# Altium integrated library ADC.IntLib: 8 symbols
Pins are listed as number, name and electrical type; pins without a type are passive.

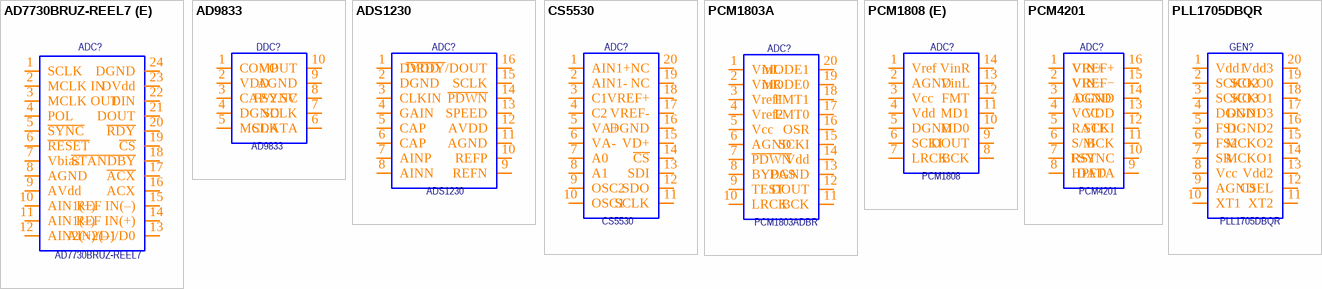
[diagram p0: symbols AD7730BRUZ-REEL7 (E) to PLL1705DBQR]

## AD7730BRUZ-REEL7 (E)
designator ADC?, comment AD7730BRUZ-REEL7
ANALOG TO DIGITAL CONVERTERS (ADCS) TSSOP-24 ROHS; Manufacturer PartNumber: AD7730; Publisher: Catcatcat Electronics; Operating Temperature: -40C to +85C; website developer: http://catcatcat.d-lan.dp.ua/; Pricing LCSC: 8.8841; HelpURL: https://datasheet.lcsc.com/szlcsc/1907181731_Analog-Devices-ADI-AD7730BRUZ-REEL7_C403860.pdf; Package / Case: TSSOP-24_4.4x7.8x0.65P; PartNumber LCSC: C403860; Assembly type: Extended Part; Value: AD7730BRUZ-REEL7
footprint TSSOP-24
pins: 1 SCLK, 2 MCLK IN, 3 MCLK OUT, 4 POL, 5 ~{SYNC}, 6 ~{RESET}, 7 Vbias, 8 AGND, 9 AVdd, 10 AIN1(+), 11 AIN1(–), 12 AIN2(+)/D1, 13 AIN2(–)/D0, 14 REF IN(+), 15 REF IN(–), 16 ACX, 17 ~{ACX}, 18 ~{STANDBY}, 19 ~{CS}, 20 ~{RDY}, 21 DOUT, 22 DIN, 23 DVdd, 24 DGND

## AD9833
designator DDC?
IC WAVEFORM GEN PROG 10MSOP; Manufacturer: Analog Devices Inc.; Manufacturer PartNumber: AD9833BRMZ-REEL; Note: Interface - Direct Digital Synthesis (DDS); Voltage: 2.3V ~ 5.5V; Detailed Description: Direct Digital Synthesis IC 10 b 25MHz 28 b Tuning 10-MSOP; Publisher: Catcatcat Electronics; Operating Temperature: -40°C ~ 105°C; website developer: http://catcatcat.d-lan.dp.ua/; PartNumber Digi-Key: AD9833BRMZ-REEL; Pricing Digi-Key: 5.48600; HelpURL: https://www.analog.com/media/en/technical-documentation/data-sheets/AD9833.pdf; Dealer Digi-Key: https://www.digikey.com/product-detail/en/analog-devices-inc/AD9833BRMZ-REEL/AD9833BRMZ-REELTR-ND/993964; Package / Case: 10-TFSOP, 10-MSOP (0.118", 3.00mm Width); Assembly type: Basic Extended Part; Value: AD9833
footprint MSOP-10
pins: 1 COMP, 2 VDD, 3 CAP/2.5V, 4 DGND, 5 MCLK, 6 SDATA, 7 SCLK, 8 FSYNC, 9 AGND, 10 VOUT

## ADS1230
designator ADC?
ADC; Publisher: Catcatcat Electronics; Operating Temperature: -40C to +85C; website developer: http://catcatcat.d-lan.dp.ua/; Assembly type: Basic Extended Part
footprint 16TSSOP_R
footprint 16TSSOP
footprint 16TSSOP_M
pins: 1 DVDD, 2 DGND, 3 CLKIN, 4 GAIN, 5 CAP, 6 CAP, 7 AINP, 8 AINN, 9 REFN, 10 REFP, 11 AGND, 12 AVDD, 13 SPEED, 14 ~{PDWN}, 15 SCLK, 16 ~{DRDY}/DOUT

## CS5530
designator ADC?
ADC; Publisher: Catcatcat Electronics; Operating Temperature: -40C to +85C; website developer: http://catcatcat.d-lan.dp.ua/; Assembly type: Basic Extended Part
footprint SSOP-20
pins: 1 AIN1+, 2 AIN1-, 3 C1, 4 C2, 5 VA+, 6 VA-, 7 A0, 8 A1, 9 OSC2, 10 OSC1, 11 SCLK, 12 SDO, 13 SDI, 14 ~{CS}, 15 VD+, 16 DGND, 17 VREF-, 18 VREF+, 19 NC, 20 NC

## PCM1803A
designator ADC?  value PCM1803ADBR
IC ADC 24BIT STER 96KHZ 20-SSOP; Manufacturer: Texas Instruments; Note: 96k; Voltage: 2.7V ~ 3.6V, 4.5V ~ 5.5V; Detailed Description: ADC, Audio 24 bit 96k Serial 20-SSOP; Publisher: Catcatcat Electronics; Operating Temperature: -40C to +85C; website developer: http://catcatcat.d-lan.dp.ua/; PartNumber Digi-Key: PCM1803ADBR; Pricing Digi-Key: 1.88727; HelpURL: http://www.ti.com/lit/ds/symlink/pcm1803a.pdf; Manufacturer PartNumber: PCM1803ADBR; Dealer Digi-Key: https://www.digikey.com/product-detail/en/texas-instruments/PCM1803ADBR/296-26305-2-ND/1573343; Package / Case: 20-SSOP (0.209", 5.30mm Width); Assembly type: Basic Extended Part
footprint SSOP-20
pins: 1 VinL, 2 VinR, 3 Vref1, 4 Vref2, 5 Vcc, 6 AGND, 7 ~{PDWN}, 8 BYPAS, 9 TEST, 10 LRCK, 11 BCK, 12 DOUT, 13 DGND, 14 Vdd, 15 SCKI, 16 OSR, 17 FMT0, 18 FMT1, 19 MODE0, 20 MODE1

## PCM1808 (E)
designator ADC?  value PCM1808
IC ADC 24BIT STER 96KHZ 14-TSSOP; Manufacturer: Texas Instruments; Manufacturer PartNumber: PCM1808PWR; Voltage: 2.7V ~ 3.6V, 4.5V ~ 5.5V; Detailed Description: ADC, Audio 24 bit 96k Serial 14-TSSOP; Publisher: Catcatcat Electronics; Operating Temperature: -10°C ~ 70°C; website developer: http://catcatcat.d-lan.dp.ua/; Dealer LCSC: https://ru.aliexpress.com/item/5-PCM1808-PCM1808PWR-TSSOP14/32937073372.html?spm=a2g0v.search0604.3.1.11d22ddesxi7Oo&transAbTest=ae803_3&ws_ab_test=searchweb0_0%2Csearchweb201602_3_10065_10068_319_10059_10884_317_10887_10696_321_322_10084_453_10083_454_10103_10618_10307_537_536_10902%2Csearchweb201603_59%2CppcSwitch_0&algo_pvid=3a2f66d0-29a9-43b9-b55f-f981b50db618&algo_expid=3a2f66d0-29a9-43b9-b55f-f981b50db618-0; PartNumber Digi-Key: PCM1808PWR; Pricing Digi-Key: 0.95040; Pricing LCSC: 0.5044; HelpURL: http://www.ti.com/lit/ds/symlink/pcm1808.pdf; Dealer Digi-Key: https://www.digikey.com/product-detail/en/texas-instruments/PCM1808PWR/296-26307-2-ND/1573355; Package / Case: 14-TSSOP (0.173", 4.40mm Width)  Width); PartNumber LCSC: C55513; Assembly type: Extended Part
footprint TSSOP-14 (PW)
pins: 1 Vref, 2 AGND, 3 Vcc, 4 Vdd, 5 DGND, 6 SCKI, 7 LRCK, 8 BCK, 9 DOUT, 10 MD0, 11 MD1, 12 FMT, 13 VinL, 14 VinR

## PCM4201
designator ADC?
IC ADC 24BIT 1CH AUDIO 16-TSSOP; Manufacturer: Texas Instruments; Manufacturer PartNumber: PCM4201PWR; Voltage: 1.65V ~ 3.6V, 5V; Publisher: Catcatcat Electronics; Operating Temperature: -10°C ~ 70°C; website developer: http://catcatcat.d-lan.dp.ua/; PartNumber Digi-Key: PCM4201PWR; Pricing Digi-Key: 2.32750; HelpURL: http://www.ti.com/lit/ds/symlink/pcm4201.pdf; Dealer Digi-Key: https://www.digikey.com/product-detail/en/texas-instruments/PCM4201PWR/296-43652-2-ND/1573432; Package / Case: 16-TSSOP (0.173", 4.40mm Width); Assembly type: Basic Extended Part; Value: PCM4201
footprint 16TSSOP_R
footprint 16TSSOP
footprint 16TSSOP_M
pins: 1 VIN+, 2 VIN−, 3 AGND, 4 VCC, 5 RATE, 6 S/M, 7 RST, 8 HPFD, 9 DATA, 10 FSYNC, 11 BCK, 12 SCKI, 13 VDD, 14 DGND, 15 VREF−, 16 VREF+

## PLL1705DBQR
designator GEN?  value PLL1705DBQR
IC PLL MULTI-CLK GEN DUAL 20QSOP; Manufacturer: Texas Instruments; Publisher: Catcatcat Electronics; Operating Temperature: -40C to +85C; website developer: http://catcatcat.d-lan.dp.ua/; PartNumber Digi-Key: PLL1705DBQR; Pricing Digi-Key: 2.42060; HelpURL: http://www.ti.com/lit/ds/symlink/pll1705.pdf; Manufacturer PartNumber: PLL1705DBQR; Dealer Digi-Key: https://www.digikey.com/product-detail/en/texas-instruments/PLL1705DBQR/PLL1705DBQR-ND/1573483; Package / Case: 20-SSOP (0.154", 3.90mm Width); Assembly type: Basic Extended Part
footprint SSOP-20
pins: 1 Vdd1, 2 SCKO2, 3 SCKO3, 4 DGND1, 5 FS1, 6 FS2, 7 SR, 8 Vcc, 9 AGND, 10 XT1, 11 XT2, 12 CSEL, 13 Vdd2, 14 MCKO1, 15 MCKO2, 16 DGND2, 17 DGND3, 18 SCKO1, 19 SCKO0, 20 Vdd3